# Altium footprint library heromap.PcbLib: 593 footprints (part 29 of 38)
Each footprint in its own frame and in the unit in brackets; x right, y up, seen from the top. Pads: shape width x height; smd on the part's side, far side on the other; paste and mask are expansions set on the pad; w line width, h text height; cw(c..) or ccw(c..) is an arc to the next point about the centre after c.
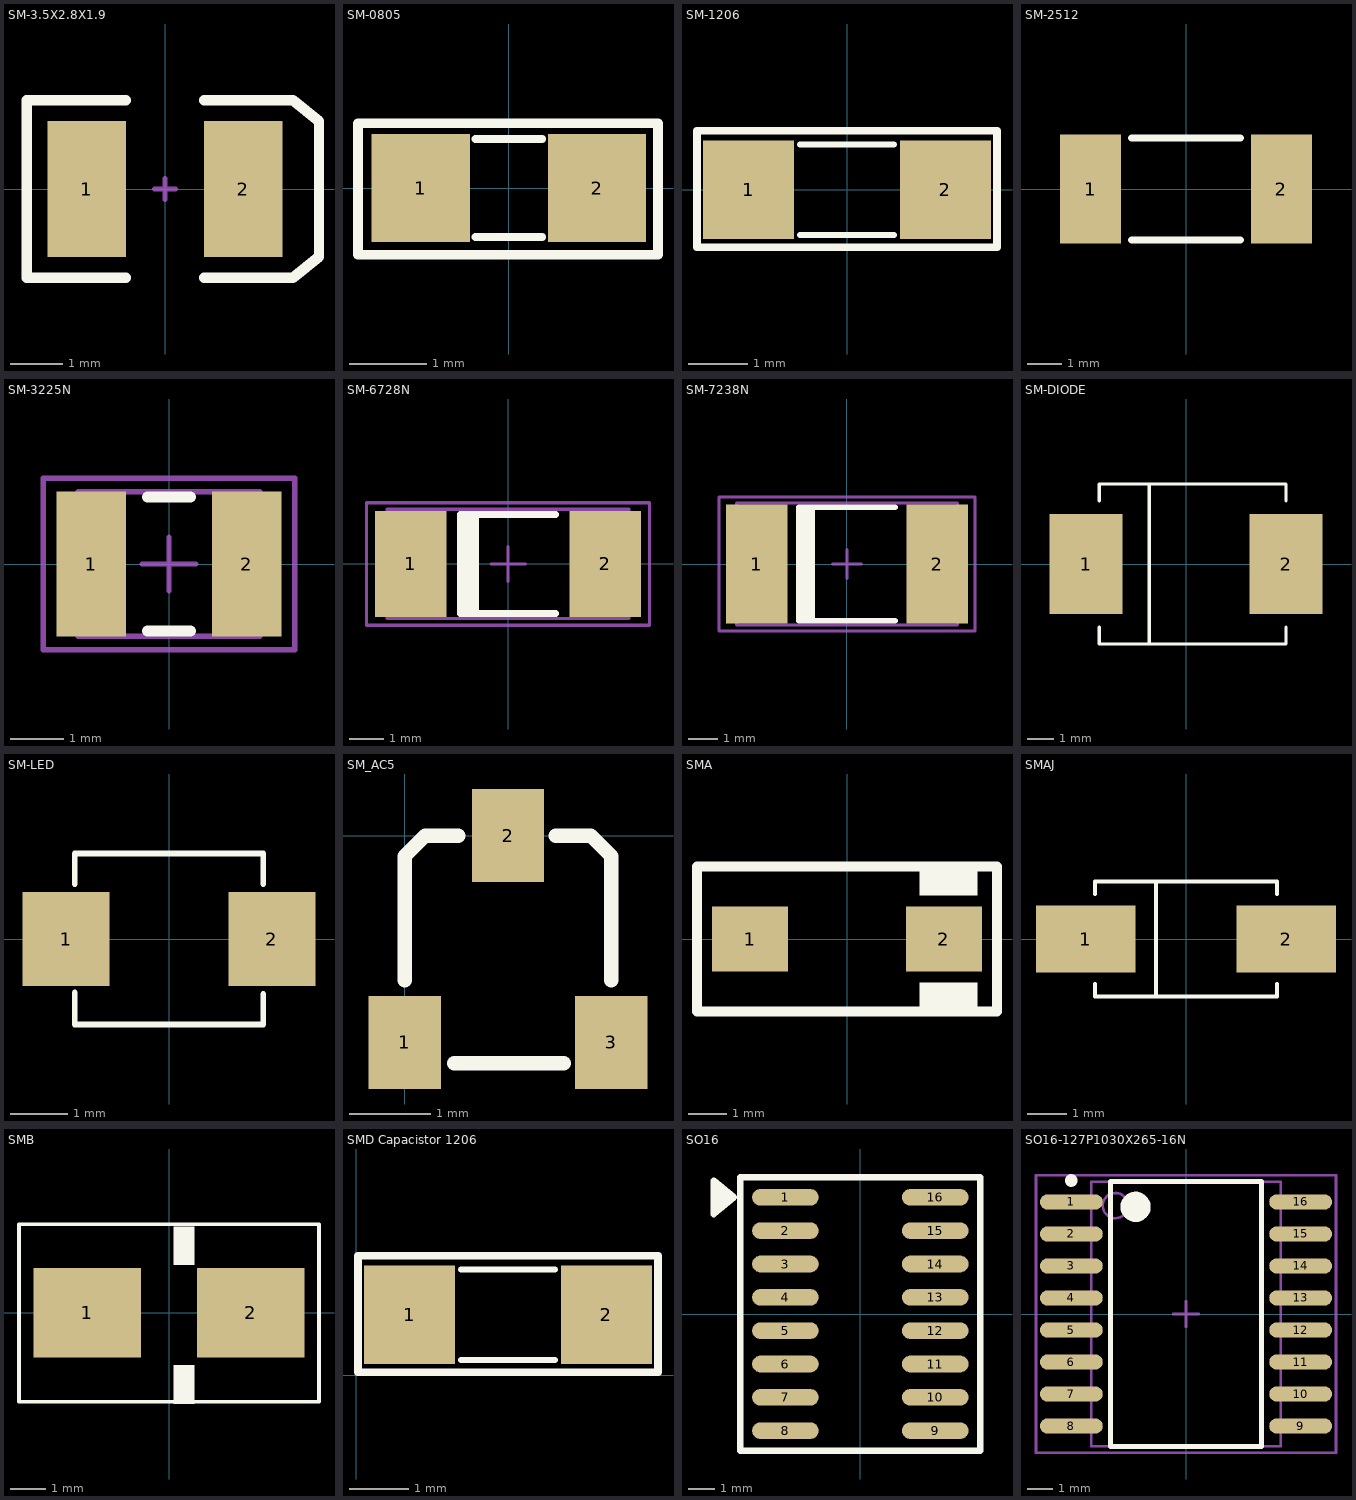
[diagram p28: the footprints below, top view; thin cyan lines are the x and y axes]

## SM-3.5X2.8X1.9 [mm] "SM LED; 2 C-Bend Leads; Body 3.5 x 2.8 x 1.9 mm, inc leads (LxWxH typ)"
height 1.9
pads (2):
  rect 1.5x2.6 smd: 1(-1.5,0) 2(1.5,0)
Top Overlay:
  lines w0.2: -0.75,-1.7 -2.65,-1.7 -2.65,1.7 -0.75,1.7 ; 0.75,-1.7 2.45,-1.7 2.95,-1.3 2.95,1.3 2.45,1.7 0.75,1.7
Mechanical 1:
  lines w0.1: -0.2,0 0.2,0 ; 0,-0.2 0,0.2

## SM-0805 [mil] "Compoment SMD 80x50mil"
height 50
pads (2):
  rect 50x55 smd: 1(-45,0) 2(45,0)
Top Overlay:
  lines w4: -17,-25 17,-25 ; -17,25 17,25
  lines w5: -77,-34 76,-34 76,33 -77,33 -77,-34
3D body "SW3dPS-smt_resistor_packages.STEP": height 24.02, standoff -0.39, extent -39.76,-25 39.76,25

## SM-1206 [mil] "Compoment SMD 120x60mil"
height 50
pads (2):
  rect 60x65 smd: 1(-65,0) 2(65,0)
Top Overlay:
  lines w4: -31,-30 31,-30 ; -31,30 31,30
  lines w5: -99,-38 -99,39 99,39 99,-38 -99,-38
3D body "User Library-res1206.STEP": height 24.79, standoff 0, extent -82.68,-35 82.68,35.87

## SM-2512 [mm] "Chip Resistor; Body 6.3 x 3.2 mm (LxW typ) - C"
height 0.6
pads (2):
  rect 1.8x3.2 smd: 1(-2.8,0) 2(2.8,0)
Top Overlay:
  lines w0.2: -1.6,-1.5 1.6,-1.5 ; -1.6,1.5 1.6,1.5
3D body "User Library-res2512_body.STEP": height 0.62, standoff 0, extent -3.159,-1.6 3.16,1.6

## SM-3225N [mm] "Chip Capacitor, Body 3.2x2.5mm, IPC Medium Density"
height 1.35
pads (2):
  rect 1.3x2.7 smd: 1(-1.45,0) 2(1.45,0)
Top Overlay:
  lines w0.2: -0.4,-1.25 0.4,-1.25 ; -0.4,1.25 0.4,1.25
Mechanical 13:
  lines w0.1: -1.7,-1.35 1.7,-1.35 1.7,1.35 -1.7,1.35 -1.7,-1.35
Mechanical 15:
  lines w0.1: -0.5,0 0.5,0 ; 0,-0.5 0,0.5 ; -2.35,-1.6 2.35,-1.6 2.35,1.6 -2.35,1.6 -2.35,-1.6
3D body: height 1.35, standoff 0, extent -1.7,-1.35 1.7,1.35

## SM-6728N [mm] "Chip Capacitor, Body 6.7x2.8mm, IPC Medium Density"
height 3.18
pads (2):
  rect 2.1x3.1 smd: 1(-2.85,0) 2(2.85,0)
Top Overlay:
  rectangle: -1.4,-1.45 -0.85,1.45
  lines w0.2: 1.4,-1.45 -1.4,-1.45 -1.4,1.45 1.4,1.45
Mechanical 13:
  lines w0.1: -3.55,-1.6 -3.55,1.6 3.55,1.6 3.55,-1.6 -3.55,-1.6
Mechanical 15:
  lines w0.1: -0.5,0 0.5,0 ; 0,-0.5 0,0.5 ; -4.15,-1.8 -4.15,1.8 4.15,1.8 4.15,-1.8 -4.15,-1.8
3D body: height 3.18, standoff 0, extent -3.55,-1.6 3.55,1.6

## SM-7238N [mm] "Chip Capacitor, Body 7.2x3.8mm, IPC Medium Density"
height 3.18
pads (2):
  rect 2.1x4.1 smd: 1(-3.1,0) 2(3.1,0)
Top Overlay:
  rectangle: -1.65,-1.95 -1.1,1.95
  lines w0.2: 1.65,-1.95 -1.65,-1.95 -1.65,1.95 1.65,1.95
Mechanical 13:
  lines w0.1: -3.8,-2.1 3.8,-2.1 3.8,2.1 -3.8,2.1 -3.8,-2.1
Mechanical 15:
  lines w0.1: -0.5,0 0.5,0 ; 0,-0.5 0,0.5 ; -4.4,-2.3 4.4,-2.3 4.4,2.3 -4.4,2.3 -4.4,-2.3
3D body: height 3.18, standoff 0, extent -3.8,-2.1 3.8,2.1

## SM-DIODE [mil] "Magnetic-Core Inductor with Winding Polarity Marking; 2 Leads"
pads (2):
  rect 110x150 smd: 1(-150,0) 2(150,0)
Top Overlay:
  lines w5: -130,-95 -130,-120 150,-120 150,-95 ; -130,95 -130,120 150,120 150,95 ; -55,-120 -55,120
Mechanical 1:
  lines w1: -130,-120 150,-120 ; -130,120 150,120

## SM-LED [mil] "Compoment SMD 120x60mil"
height 50
pads (2):
  rect 60x65 smd: 1(-71,0) 2(71,0)
Top Overlay:
  lines w4: -65,-37 -65,-59 65,-59 65,-38 ; -65,38 -65,59 65,59 65,38

## SM_AC5 [mil]
pads (3):
  rect 35x45 smd: 1(0,-100) 2(50,0) 3(100,-100)
Top Overlay:
  lines w7: 0,-70 0,-10 10,0 26,0 ; 24,-110 77,-110 ; 73,0 90,0 100,-10 100,-70

## SMA [mm]
pads (2):
  rect 2x1.7 smd: 1(-2.544,0) 2(2.544,0)
Top Overlay:
  rectangle: 1.905,-1.905 3.429,-1.145
  region: 3.429,1.905 1.905,1.905 1.905,1.145 3.429,1.145
  lines w0.254: -3.937,-1.903 3.937,-1.903 3.937,1.903 -3.937,1.903 -3.937,-1.903
3D body: height 0.2, standoff 0, extent 2.032,-0.864 2.87,0.864
3D body: height 1.14, standoff 0, extent 2.718,-0.864 2.87,0.864
3D body: height 1.14, standoff 0.94, extent 2.489,-0.864 2.87,0.864
3D body: height 2.29, standoff 0.2, extent 2.032,-0.864 2.642,0.864
3D body: height 2.29, standoff 0.2, extent -2.642,-0.864 -2.032,0.864
3D body: height 1.14, standoff 0.94, extent -2.87,-0.864 -2.489,0.864
3D body: height 1.14, standoff 0, extent -2.87,-0.864 -2.718,0.864
3D body: height 0.2, standoff 0, extent -2.87,-0.864 -2.032,0.864
3D body: height 2.29, standoff 0.2, extent -2.64,-1.395 2.642,1.395

## SMAJ [mm] "SMAJ5.0A/CA,SMAJ24CA..."
pads (2):
  rect 2.52x1.7 smd: 1(-2.535,0) 2(2.535,0)
Top Overlay:
  lines w0.102: -2.3,-1.143 -2.3,-1.46 2.3,-1.46 2.3,-1.143 ; -2.3,1.143 -2.3,1.46 2.3,1.46 2.3,1.143 ; -0.762,-1.46 -0.762,1.46
3D body: height 1.31, standoff 0, extent 1.27,-0.889 2.54,0.889
3D body: height 1.31, standoff 0, extent -2.54,-0.889 -1.27,0.889
3D body: height 2.62, standoff 0.2, extent -2.3,-1.46 2.3,1.46

## SMB [mm]
pads (2):
  rect 3x2.5 smd: 1(-2.286,0) 2(2.286,0)
Top Overlay:
  region: 0.711,-1.459 0.127,-1.459 0.127,-2.54 0.711,-2.54
  rectangle: 0.127,1.332 0.711,2.413
  lines w0.102: -4.191,-2.478 4.191,-2.478 4.191,2.478 -4.191,2.478 -4.191,-2.478
3D body: height 0.2, standoff 0, extent 1.295,-1.245 2.794,1.27
3D body: height 1.14, standoff 0, extent 2.591,-1.245 2.794,1.27
3D body: height 1.14, standoff 0.94, extent 2.286,-1.245 2.794,1.27
3D body: height 2.29, standoff 0.2, extent 1.295,-1.245 2.286,1.27
3D body: height 2.29, standoff 0.2, extent -2.286,-1.245 -1.295,1.245
3D body: height 1.14, standoff 0.94, extent -2.794,-1.245 -2.286,1.245
3D body: height 1.14, standoff 0, extent -2.794,-1.245 -2.667,1.245
3D body: height 0.2, standoff 0, extent -2.794,-1.245 -1.295,1.245
3D body: height 2.29, standoff 0.2, extent -2.286,-1.97 2.286,1.97
3D body: height 2.3, standoff 2.29, extent 0.127,-2.021 0.711,1.905

## SMD Capacistor 1206 [mil]
pads (2):
  rect 60x65 smd: 1(35,40) 2(165,40)
Top Overlay:
  lines w4: 69,10 131,10 ; 69,70 131,70
  lines w5: 1,2 1,79 199,79 199,2 1,2
3D body "SW3dPS-smt_resistor_packages.STEP": height 24.02, standoff -0.39, extent 60.24,15 139.76,65

## SO16 [mm]
pads (16):
  oval 2.54x0.635 smd: 1(-2.854,4.445) 2(-2.854,3.175) 3(-2.854,1.905) 4(-2.854,0.635) 5(-2.854,-0.635) 6(-2.854,-1.905) 7(-2.854,-3.175) 8(-2.854,-4.445) 9(2.854,-4.445) 10(2.854,-3.175) 11(2.854,-1.905) 12(2.854,-0.635) 13(2.854,0.635) 14(2.854,1.905) 15(2.854,3.175) 16(2.854,4.445)
Top Overlay:
  region: -4.826,4.445 -5.588,5.08 -5.588,3.81
  lines w0.254: -5.588,3.81 -5.588,5.08 -4.826,4.445 -5.588,3.81 ; -4.572,-5.207 -4.572,5.207 4.572,5.207 4.572,-5.207 -4.572,-5.207
3D body: height 1.75, standoff 0, extent -1.95,-4.95 1.95,4.95
3D body: height 0.2, standoff 0, extent -3.475,4.204 -2.779,4.696
3D body: height 0.9, standoff 0, extent -2.779,4.204 -2.454,4.696
3D body: height 0.9, standoff 0.7, extent -2.454,4.204 -1.415,4.696
3D body: height 0.9, standoff 0.7, extent -2.454,2.934 -1.415,3.426
3D body: height 0.9, standoff 0, extent -2.779,2.934 -2.454,3.426
3D body: height 0.2, standoff 0, extent -3.475,2.934 -2.779,3.426
3D body: height 0.2, standoff 0, extent -3.475,0.394 -2.779,0.886
3D body: height 0.9, standoff 0, extent -2.779,0.394 -2.454,0.886
3D body: height 0.9, standoff 0.7, extent -2.454,0.394 -1.415,0.886
3D body: height 0.9, standoff 0.7, extent -2.454,1.664 -1.415,2.156
3D body: height 0.9, standoff 0, extent -2.779,1.664 -2.454,2.156
3D body: height 0.2, standoff 0, extent -3.475,1.664 -2.779,2.156
3D body: height 0.2, standoff 0, extent -3.475,-2.146 -2.779,-1.654
3D body: height 0.9, standoff 0, extent -2.779,-2.146 -2.454,-1.654
3D body: height 0.9, standoff 0.7, extent -2.454,-2.146 -1.415,-1.654
3D body: height 0.9, standoff 0.7, extent -2.454,-0.876 -1.415,-0.384
3D body: height 0.9, standoff 0, extent -2.779,-0.876 -2.454,-0.384
3D body: height 0.2, standoff 0, extent -3.475,-0.876 -2.779,-0.384
3D body: height 0.2, standoff 0, extent -3.475,-4.686 -2.779,-4.194
3D body: height 0.9, standoff 0, extent -2.779,-4.686 -2.454,-4.194
3D body: height 0.9, standoff 0.7, extent -2.454,-4.686 -1.415,-4.194
3D body: height 0.9, standoff 0.7, extent -2.454,-3.416 -1.415,-2.924
3D body: height 0.9, standoff 0, extent -2.779,-3.416 -2.454,-2.924
3D body: height 0.2, standoff 0, extent -3.475,-3.416 -2.779,-2.924
3D body: height 0.2, standoff 0, extent 2.779,2.924 3.475,3.416
3D body: height 0.9, standoff 0, extent 2.454,2.924 2.779,3.416
3D body: height 0.9, standoff 0.7, extent 1.415,2.924 2.454,3.416
3D body: height 0.9, standoff 0.7, extent 1.415,4.194 2.454,4.686
3D body: height 0.9, standoff 0, extent 2.454,4.194 2.779,4.686
3D body: height 0.2, standoff 0, extent 2.779,4.194 3.475,4.686
3D body: height 0.2, standoff 0, extent 2.779,0.384 3.475,0.876
3D body: height 0.9, standoff 0, extent 2.454,0.384 2.779,0.876
3D body: height 0.9, standoff 0.7, extent 1.415,0.384 2.454,0.876
3D body: height 0.9, standoff 0.7, extent 1.415,1.654 2.454,2.146
3D body: height 0.9, standoff 0, extent 2.454,1.654 2.779,2.146
3D body: height 0.2, standoff 0, extent 2.779,1.654 3.475,2.146
3D body: height 0.2, standoff 0, extent 2.779,-2.156 3.475,-1.664
3D body: height 0.9, standoff 0, extent 2.454,-2.156 2.779,-1.664
3D body: height 0.9, standoff 0.7, extent 1.415,-2.156 2.454,-1.664
3D body: height 0.9, standoff 0.7, extent 1.415,-0.886 2.454,-0.394
3D body: height 0.9, standoff 0, extent 2.454,-0.886 2.779,-0.394
3D body: height 0.2, standoff 0, extent 2.779,-0.886 3.475,-0.394
3D body: height 0.2, standoff 0, extent 2.779,-3.426 3.475,-2.934
3D body: height 0.9, standoff 0, extent 2.454,-3.426 2.779,-2.934
3D body: height 0.9, standoff 0.7, extent 1.415,-3.426 2.454,-2.934
3D body: height 0.9, standoff 0.7, extent 1.415,-4.696 2.454,-4.204
3D body: height 0.9, standoff 0, extent 2.454,-4.696 2.779,-4.204
3D body: height 0.2, standoff 0, extent 2.779,-4.696 3.475,-4.204

## SO16-127P1030X265-16N [mm] "SOIC, 16-Leads, Body 10.5x7.5mm (max), Pitch 1.27mm, IPC Medium Density"
height 2.65
pads (16):
  oval 2.5x0.6 smd: 1(-4.55,4.445) 2(-4.55,3.175) 3(-4.55,1.905) 4(-4.55,0.635) 5(-4.55,-0.635) 6(-4.55,-1.905) 7(-4.55,-3.175) 8(-4.55,-4.445) 9(4.55,-4.445) 10(4.55,-3.175) 11(4.55,-1.905) 12(4.55,-0.635) 13(4.55,0.635) 14(4.55,1.905) 15(4.55,3.175) 16(4.55,4.445)
Top Overlay:
  circle w0.25: c-4.55,5.295 r0.125
  circle w0.6: c-2,4.25 r0.3
  lines w0.2: -3,-5.25 -3,5.25 3,5.25 3,-5.25 -3,-5.25
Mechanical 13:
  circle w0.1: c-2.8,4.3 r0.5
  lines w0.1: -3.75,-5.25 -3.75,5.25 3.75,5.25 3.75,-5.25 -3.75,-5.25
Mechanical 15:
  lines w0.1: -0.5,0 0.5,0 ; 0,-0.5 0,0.5 ; -5.95,-5.5 -5.95,5.5 5.95,5.5 5.95,-5.5 -5.95,-5.5
3D body: height 1.38, standoff 1.28, extent -4.207,-4.699 -3.775,-4.191
3D body: height 1.38, standoff 0, extent -4.309,-4.699 -4.207,-4.191
3D body: height 0.1, standoff 0, extent -5.147,-4.699 -4.309,-4.191
3D body: height 1.38, standoff 1.28, extent -4.207,-3.429 -3.775,-2.921
3D body: height 1.38, standoff 0, extent -4.309,-3.429 -4.207,-2.921
3D body: height 0.1, standoff 0, extent -5.147,-3.429 -4.309,-2.921
3D body: height 1.38, standoff 1.28, extent -4.207,-2.159 -3.775,-1.651
3D body: height 1.38, standoff 0, extent -4.309,-2.159 -4.207,-1.651
3D body: height 0.1, standoff 0, extent -5.147,-2.159 -4.309,-1.651
3D body: height 1.38, standoff 1.28, extent -4.207,-0.889 -3.775,-0.381
3D body: height 1.38, standoff 0, extent -4.309,-0.889 -4.207,-0.381
3D body: height 0.1, standoff 0, extent -5.147,-0.889 -4.309,-0.381
3D body: height 1.38, standoff 1.28, extent -4.207,0.381 -3.775,0.889
3D body: height 1.38, standoff 0, extent -4.309,0.381 -4.207,0.889
3D body: height 0.1, standoff 0, extent -5.147,0.381 -4.309,0.889
3D body: height 1.38, standoff 1.28, extent -4.207,1.651 -3.775,2.159
3D body: height 1.38, standoff 0, extent -4.309,1.651 -4.207,2.159
3D body: height 0.1, standoff 0, extent -5.147,1.651 -4.309,2.159
3D body: height 1.38, standoff 1.28, extent -4.207,2.921 -3.775,3.429
3D body: height 1.38, standoff 0, extent -4.309,2.921 -4.207,3.429
3D body: height 0.1, standoff 0, extent -5.147,2.921 -4.309,3.429
3D body: height 1.38, standoff 1.28, extent -4.207,4.191 -3.775,4.699
3D body: height 1.38, standoff 0, extent -4.309,4.191 -4.207,4.699
3D body: height 0.1, standoff 0, extent -5.147,4.191 -4.309,4.699
3D body: height 1.38, standoff 1.28, extent 3.801,0.381 4.233,0.889
3D body: height 1.38, standoff 0, extent 4.233,0.381 4.334,0.889
3D body: height 0.1, standoff 0, extent 4.334,0.381 5.172,0.889
3D body: height 1.38, standoff 1.28, extent 3.801,-0.889 4.233,-0.381
3D body: height 1.38, standoff 0, extent 4.233,-0.889 4.334,-0.381
3D body: height 0.1, standoff 0, extent 4.334,-0.889 5.172,-0.381
3D body: height 1.38, standoff 1.28, extent 3.775,-2.159 4.207,-1.651
3D body: height 1.38, standoff 0, extent 4.207,-2.159 4.309,-1.651
3D body: height 0.1, standoff 0, extent 4.309,-2.159 5.147,-1.651
3D body: height 1.38, standoff 1.28, extent 3.775,-3.429 4.207,-2.921
3D body: height 1.38, standoff 0, extent 4.207,-3.429 4.309,-2.921
3D body: height 0.1, standoff 0, extent 4.309,-3.429 5.147,-2.921
3D body: height 1.38, standoff 1.28, extent 3.775,-4.699 4.207,-4.191
3D body: height 1.38, standoff 0, extent 4.207,-4.699 4.309,-4.191
3D body: height 0.1, standoff 0, extent 4.309,-4.699 5.147,-4.191
3D body: height 1.38, standoff 1.28, extent 3.775,-0.889 4.207,-0.381
3D body: height 1.38, standoff 0, extent 4.207,-0.889 4.309,-0.381
3D body: height 0.1, standoff 0, extent 4.309,-0.889 5.147,-0.381
3D body: height 1.38, standoff 1.28, extent 3.775,0.381 4.207,0.889
3D body: height 1.38, standoff 0, extent 4.207,0.381 4.309,0.889
3D body: height 0.1, standoff 0, extent 4.309,0.381 5.147,0.889
3D body: height 1.38, standoff 1.28, extent 3.775,1.651 4.207,2.159
3D body: height 1.38, standoff 0, extent 4.207,1.651 4.309,2.159
3D body: height 0.1, standoff 0, extent 4.309,1.651 5.147,2.159
3D body: height 1.38, standoff 1.28, extent 3.775,2.921 4.207,3.429
3D body: height 1.38, standoff 0, extent 4.207,2.921 4.309,3.429
3D body: height 0.1, standoff 0, extent 4.309,2.921 5.147,3.429
3D body: height 1.38, standoff 1.28, extent 3.775,4.191 4.207,4.699
3D body: height 1.38, standoff 0, extent 4.207,4.191 4.309,4.699
3D body: height 0.1, standoff 0, extent 4.309,4.191 5.147,4.699
3D body: height 2.65, standoff 0.1, extent -3.75,-5.25 3.75,5.25